# Altium footprint library Zmod.PcbLib: 129 footprints (part 5 of 9)
Each footprint in its own frame and in the unit in brackets; x right, y up, seen from the top. Pads: shape width x height; smd on the part's side, far side on the other; paste and mask are expansions set on the pad; w line width, h text height; cw(c..) or ccw(c..) is an arc to the next point about the centre after c.
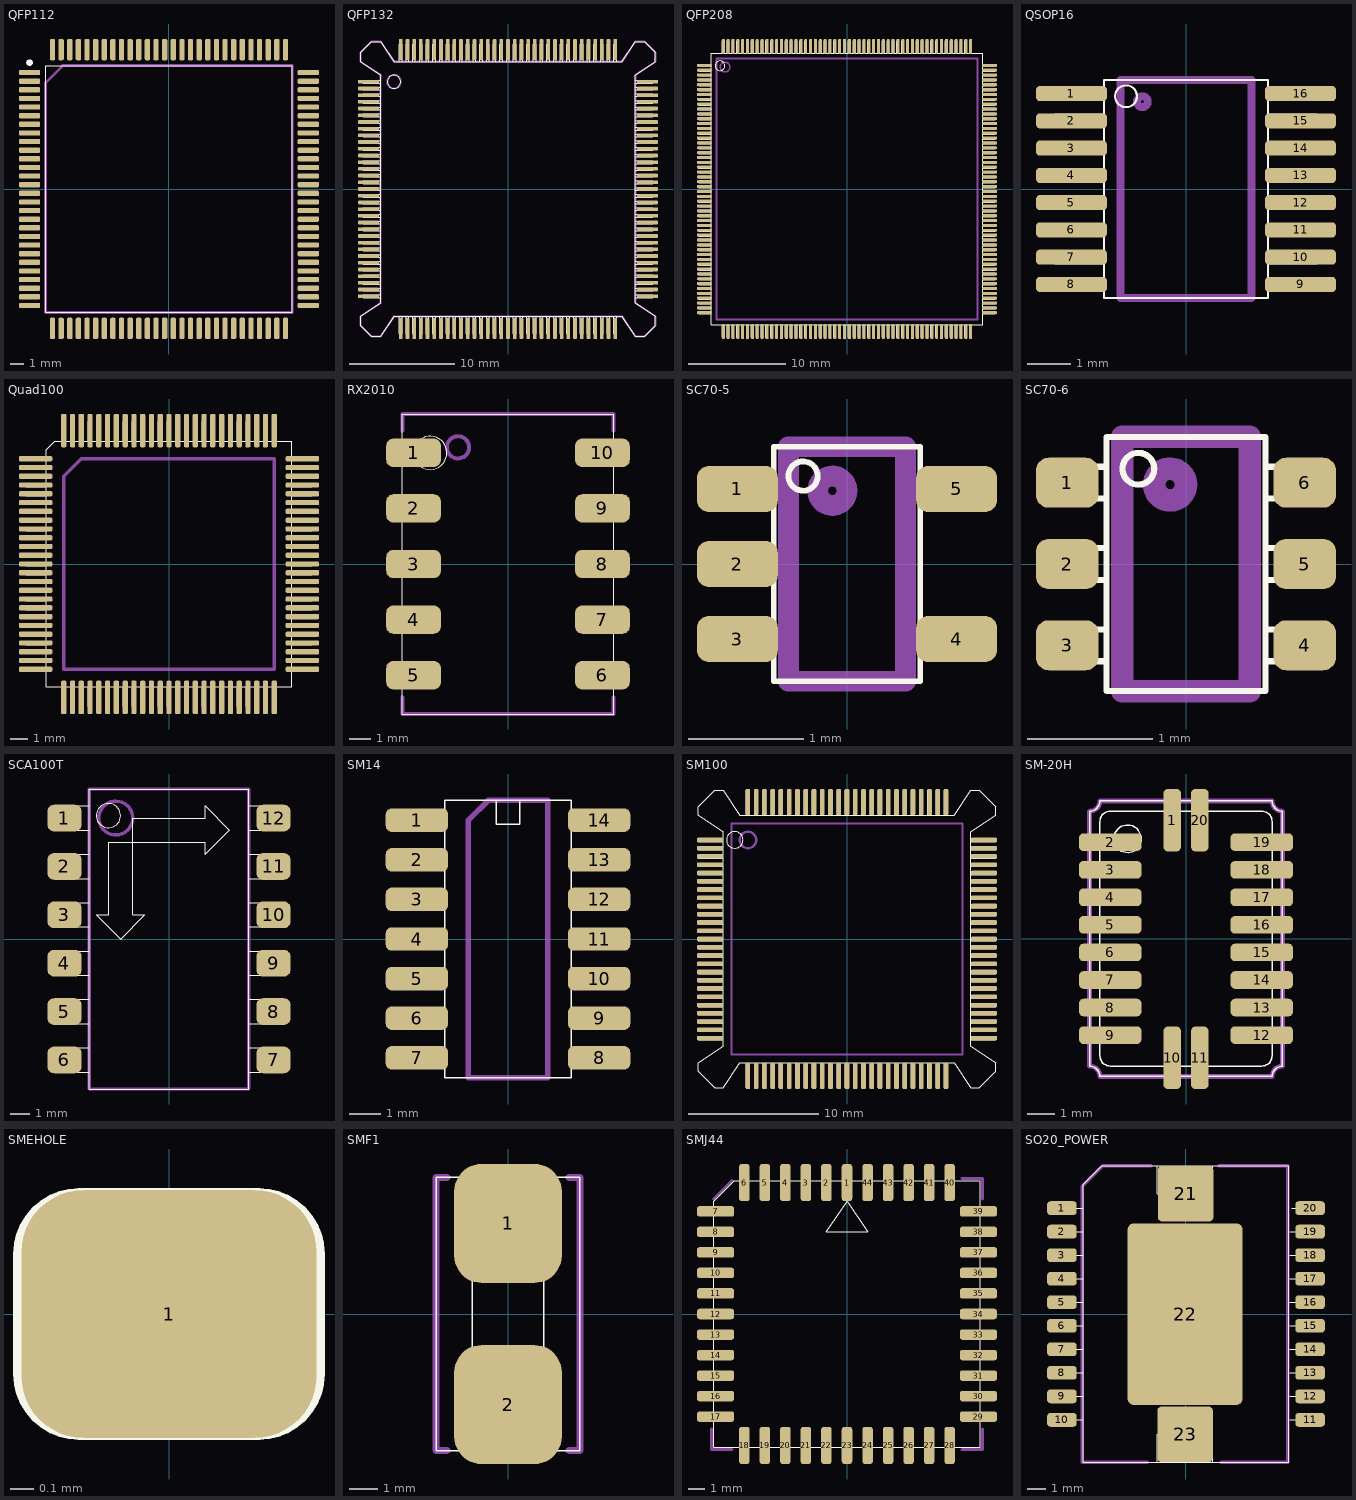
[diagram p4: the footprints below, top view; thin cyan lines are the x and y axes]

## QFP112 [mm] "QFP; 112 Leads; Body 20 x 20 mm; Pitch 0.65 mm. Rev. 1"
height 1.6
pads (112):
  rrect50% 1.6x0.4 smd: 1(-10.5,8.775) 2(-10.5,8.125) 3(-10.5,7.475) 4(-10.5,6.825) 5(-10.5,6.175) 6(-10.5,5.525) 7(-10.5,4.875) 8(-10.5,4.225) 9(-10.5,3.575) 10(-10.5,2.925) 11(-10.5,2.275) 12(-10.5,1.625) 13(-10.5,0.975) 14(-10.5,0.325) 15(-10.5,-0.325) 16(-10.5,-0.975) 17(-10.5,-1.625) 18(-10.5,-2.275) 19(-10.5,-2.925) 20(-10.5,-3.575) 21(-10.5,-4.225) 22(-10.5,-4.875) 23(-10.5,-5.525) 24(-10.5,-6.175) 25(-10.5,-6.825) 26(-10.5,-7.475) 27(-10.5,-8.125) 28(-10.5,-8.775) 57(10.5,-8.775) 58(10.5,-8.125) 59(10.5,-7.475) 60(10.5,-6.825) 61(10.5,-6.175) 62(10.505,-5.525) 63(10.5,-4.875) 64(10.5,-4.225) 65(10.5,-3.575) 66(10.5,-2.925) 67(10.5,-2.275) 68(10.5,-1.625) 69(10.5,-0.975) 70(10.5,-0.325) 71(10.5,0.325) 72(10.5,0.975) 73(10.5,1.625) 74(10.5,2.275) 75(10.5,2.925) 76(10.5,3.575) 77(10.5,4.225) 78(10.5,4.875) 79(10.5,5.525) 80(10.5,6.175) 81(10.5,6.825) 82(10.5,7.475) 83(10.5,8.125) 84(10.5,8.775)
  rrect50% 0.4x1.6 smd: 29(-8.775,-10.5) 30(-8.125,-10.5) 31(-7.475,-10.5) 32(-6.825,-10.5) 33(-6.175,-10.5) 34(-5.525,-10.5) 35(-4.875,-10.5) 36(-4.225,-10.5) 37(-3.575,-10.5) 38(-2.925,-10.5) 39(-2.275,-10.5) 40(-1.625,-10.5) 41(-0.975,-10.5) 42(-0.325,-10.5) 43(0.325,-10.5) 44(0.975,-10.5) 45(1.625,-10.5) 46(2.275,-10.5) 47(2.925,-10.5) 48(3.575,-10.5) 49(4.225,-10.5) 50(4.875,-10.5) 51(5.525,-10.5) 52(6.175,-10.5) 53(6.825,-10.5) 54(7.475,-10.5) 55(8.125,-10.5) 56(8.775,-10.5) 85(8.775,10.5) 86(8.125,10.5) 87(7.475,10.5) 88(6.825,10.5) 89(6.175,10.5) 90(5.525,10.5) 91(4.875,10.5) 92(4.225,10.5) 93(3.575,10.5) 94(2.925,10.5) 95(2.275,10.5) 96(1.625,10.5) 97(0.975,10.5) 98(0.325,10.5) 99(-0.325,10.5) 100(-0.975,10.5) 101(-1.625,10.5) 102(-2.275,10.5) 103(-2.925,10.5) 104(-3.575,10.5) 105(-4.225,10.5) 106(-4.875,10.5) 107(-5.525,10.5) 108(-6.175,10.5) 109(-6.825,10.5) 110(-7.475,10.5) 111(-8.125,10.5) 112(-8.775,10.5)
Top Overlay:
  circle w0.25: c-10.505,9.525 r0.125
  lines w0.05: -9.3,-9.3 -9.3,9.3 9.3,9.3 9.3,-9.3 -9.3,-9.3
Mechanical 15:
  lines w0.2: -9.3,-9.3 -9.3,8 -8,9.3 9.3,9.3 9.3,-9.3 -9.3,-9.3
  text ".Designator" at -6.8,-0.2 h1.5

## QFP132 [mm]
height 4.318
pads (132):
  rrect50% 2x0.35 smd paste+0: 1(-13.208,10.16) 2(-13.208,9.525) 3(-13.208,8.89) 4(-13.208,8.255) 5(-13.208,7.62) 6(-13.208,6.985) 7(-13.208,6.35) 8(-13.208,5.715) 9(-13.208,5.08) 10(-13.208,4.445) 11(-13.208,3.81) 12(-13.208,3.175) 13(-13.208,2.54) 14(-13.208,1.905) 15(-13.208,1.27) 16(-13.208,0.635) 17(-13.208,0) 18(-13.208,-0.635) 19(-13.208,-1.27) 20(-13.208,-1.905) 21(-13.208,-2.54) 22(-13.208,-3.175) 23(-13.208,-3.81) 24(-13.208,-4.445) 25(-13.208,-5.08) 26(-13.208,-5.715) 27(-13.208,-6.35) 28(-13.208,-6.985) 29(-13.208,-7.62) 30(-13.208,-8.255) 31(-13.208,-8.89) 32(-13.208,-9.525) 33(-13.208,-10.16) 67(13.208,-10.16) 68(13.208,-9.525) 69(13.208,-8.89) 70(13.208,-8.255) 71(13.208,-7.62) 72(13.208,-6.985) 73(13.208,-6.35) 74(13.208,-5.715) 75(13.208,-5.08) 76(13.208,-4.445) 77(13.208,-3.81) 78(13.208,-3.175) 79(13.208,-2.54) 80(13.208,-1.905) 81(13.208,-1.27) 82(13.208,-0.635) 83(13.208,0) 84(13.208,0.635) 85(13.208,1.27) 86(13.208,1.905) 87(13.208,2.54) 88(13.208,3.175) 89(13.208,3.81) 90(13.208,4.445) 91(13.208,5.08) 92(13.208,5.715) 93(13.208,6.35) 94(13.208,6.985) 95(13.208,7.62) 96(13.208,8.255) 97(13.208,8.89) 98(13.208,9.525) 99(13.208,10.16)
  rrect50% 0.35x2 smd paste+0: 34(-10.16,-13.208) 35(-9.525,-13.208) 36(-8.89,-13.208) 37(-8.255,-13.208) 38(-7.62,-13.208) 39(-6.985,-13.208) 40(-6.35,-13.208) 41(-5.715,-13.208) 42(-5.08,-13.208) 43(-4.445,-13.208) 44(-3.81,-13.208) 45(-3.175,-13.208) 46(-2.54,-13.208) 47(-1.905,-13.208) 48(-1.27,-13.208) 49(-0.635,-13.208) 50(0,-13.208) 51(0.635,-13.208) 52(1.27,-13.208) 53(1.905,-13.208) 54(2.54,-13.208) 55(3.175,-13.208) 56(3.81,-13.208) 57(4.445,-13.208) 58(5.08,-13.208) 59(5.715,-13.208) 60(6.35,-13.208) 61(6.985,-13.208) 62(7.62,-13.208) 63(8.255,-13.208) 64(8.89,-13.208) 65(9.525,-13.208) 66(10.16,-13.208) 100(10.16,13.208) 101(9.525,13.208) 102(8.89,13.208) 103(8.255,13.208) 104(7.62,13.208) 105(6.985,13.208) 106(6.35,13.208) 107(5.715,13.208) 108(5.08,13.208) 109(4.445,13.208) 110(3.81,13.208) 111(3.175,13.208) 112(2.54,13.208) 113(1.905,13.208) 114(1.27,13.208) 115(0.635,13.208) 116(0,13.208) 117(-0.635,13.208) 118(-1.27,13.208) 119(-1.905,13.208) 120(-2.54,13.208) 121(-3.175,13.208) 122(-3.81,13.208) 123(-4.445,13.208) 124(-5.08,13.208) 125(-5.715,13.208) 126(-6.35,13.208) 127(-6.985,13.208) 128(-7.62,13.208) 129(-8.255,13.208) 130(-8.89,13.208) 131(-9.525,13.208) 132(-10.16,13.208)
Top Overlay:
  drawing of 427 lines, arcs and shapes, not listed
Mechanical 15:
  lines w0.18: -13.97,-12.954 -12.954,-13.97 -12.065,-13.97 -10.795,-12.065 10.795,-12.065 12.065,-13.97 12.954,-13.97 13.97,-12.954 13.97,-12.065 12.065,-10.795 12.065,10.795 13.97,12.065 13.97,12.954 12.954,13.97 12.065,13.97 10.795,12.065 -10.795,12.065 -12.065,13.97 -12.954,13.97 -13.97,12.954 -13.97,12.065 -12.065,10.795 -12.065,-10.795 -13.97,-12.065 -13.97,-12.954 ; -11.43,10.16 ccw(c-10.795,10.16) -10.16,10.16 ccw(c-10.795,10.16) -11.43,10.16
  text ".Designator" at -5.207,8.763 h1.5

## QFP208 [mil]
height 170
pads (208):
  rrect50% 60x12 smd paste+0: 1(-578.74,501.97) 2(-578.74,482.28) 3(-578.74,462.6) 4(-578.74,442.91) 5(-578.74,423.23) 6(-578.74,403.54) 7(-578.74,383.86) 8(-578.74,364.17) 9(-578.74,344.49) 10(-578.74,324.8) 11(-578.74,305.12) 12(-578.74,285.43) 13(-578.74,265.75) 14(-578.74,246.06) 15(-578.74,226.38) 16(-578.74,206.69) 17(-578.74,187.01) 18(-578.74,167.32) 19(-578.74,147.64) 20(-578.74,127.95) 21(-578.74,108.27) 22(-578.74,88.58) 23(-578.74,68.9) 24(-578.74,49.21) 25(-578.74,29.53) 26(-578.74,9.84) 27(-578.74,-9.84) 28(-578.74,-29.53) 29(-578.74,-49.21) 30(-578.74,-68.9) 31(-578.74,-88.58) 32(-578.74,-108.27) 33(-578.74,-127.95) 34(-578.74,-147.64) 35(-578.74,-167.32) 36(-578.74,-187.01) 37(-578.74,-206.69) 38(-578.74,-226.38) 39(-578.74,-246.06) 40(-578.74,-265.75) 41(-578.74,-285.43) 42(-578.74,-305.12) 43(-578.74,-324.8) 44(-578.74,-344.49) 45(-578.74,-364.17) 46(-578.74,-383.86) 47(-578.74,-403.54) 48(-578.74,-423.23) 49(-578.74,-442.91) 50(-578.74,-462.6) 51(-578.74,-482.28) 52(-578.74,-501.97) 105(578.74,-501.97) 106(578.74,-482.28) 107(578.74,-462.6) 108(578.74,-442.91) 109(578.74,-423.23) 110(578.74,-403.54) 111(578.74,-383.86) 112(578.74,-364.17) 113(578.74,-344.49) 114(578.74,-324.8) 115(578.74,-305.12) 116(578.74,-285.43) 117(578.74,-265.75) 118(578.74,-246.06) 119(578.74,-226.38) 120(578.74,-206.69) 121(578.74,-187.01) 122(578.74,-167.32) 123(578.74,-147.64) 124(578.74,-127.95) 125(578.74,-108.27) 126(578.74,-88.58) 127(578.74,-68.9) 128(578.74,-49.21) 129(578.74,-29.53) 130(578.74,-9.84) 131(578.74,9.84) 132(578.74,29.53) 133(578.74,49.21) 134(578.74,68.9) 135(578.74,88.58) 136(578.74,108.27) 137(578.74,127.95) 138(578.74,147.64) 139(578.74,167.32) 140(578.74,187.01) 141(578.74,206.69) 142(578.74,226.38) 143(578.74,246.06) 144(578.74,265.75) 145(578.74,285.43) 146(578.74,305.12) 147(578.74,324.8) 148(578.74,344.49) 149(578.74,364.17) 150(578.74,383.86) 151(578.74,403.54) 152(578.74,423.23) 153(578.74,442.91) 154(578.74,462.6) 155(578.74,482.28) 156(578.74,501.97)
  rrect50% 12x60 smd paste+0: 53(-501.97,-578.74) 54(-482.28,-578.74) 55(-462.6,-578.74) 56(-442.91,-578.74) 57(-423.23,-578.74) 58(-403.54,-578.74) 59(-383.86,-578.74) 60(-364.17,-578.74) 61(-344.49,-578.74) 62(-324.8,-578.74) 63(-305.12,-578.74) 64(-285.43,-578.74) 65(-265.75,-578.74) 66(-246.06,-578.74) 67(-226.38,-578.74) 68(-206.69,-578.74) 69(-187.01,-578.74) 70(-167.32,-578.74) 71(-147.64,-578.74) 72(-127.95,-578.74) 73(-108.27,-578.74) 74(-88.58,-578.74) 75(-68.9,-578.74) 76(-49.21,-578.74) 77(-29.53,-578.74) 78(-9.84,-578.74) 79(9.84,-578.74) 80(29.53,-578.74) 81(49.21,-578.74) 82(68.9,-578.74) 83(88.58,-578.74) 84(108.27,-578.74) 85(127.95,-578.74) 86(147.64,-578.74) 87(167.32,-578.74) 88(187.01,-578.74) 89(206.69,-578.74) 90(226.38,-578.74) 91(246.06,-578.74) 92(265.75,-578.74) 93(285.43,-578.74) 94(305.12,-578.74) 95(324.8,-578.74) 96(344.49,-578.74) 97(364.17,-578.74) 98(383.86,-578.74) 99(403.54,-578.74) 100(423.23,-578.74) 101(442.91,-578.74) 102(462.6,-578.74) 103(482.28,-578.74) 104(501.97,-578.74) 157(501.97,578.74) 158(482.28,578.74) 159(462.6,578.74) 160(442.91,578.74) 161(423.23,578.74) 162(403.54,578.74) 163(383.86,578.74) 164(364.17,578.74) 165(344.49,578.74) 166(324.8,578.74) 167(305.12,578.74) 168(285.43,578.74) 169(265.75,578.74) 170(246.06,578.74) 171(226.38,578.74) 172(206.69,578.74) 173(187.01,578.74) 174(167.32,578.74) 175(147.64,578.74) 176(127.95,578.74) 177(108.27,578.74) 178(88.58,578.74) 179(68.9,578.74) 180(49.21,578.74) 181(29.53,578.74) 182(9.84,578.74) 183(-9.84,578.74) 184(-29.53,578.74) 185(-49.21,578.74) 186(-68.9,578.74) 187(-88.58,578.74) 188(-108.27,578.74) 189(-127.95,578.74) 190(-147.64,578.74) 191(-167.32,578.74) 192(-187.01,578.74) 193(-206.69,578.74) 194(-226.38,578.74) 195(-246.06,578.74) 196(-265.75,578.74) 197(-285.43,578.74) 198(-305.12,578.74) 199(-324.8,578.74) 200(-344.49,578.74) 201(-364.17,578.74) 202(-383.86,578.74) 203(-403.54,578.74) 204(-423.23,578.74) 205(-442.91,578.74) 206(-462.6,578.74) 207(-482.28,578.74) 208(-501.97,578.74)
Top Overlay:
  drawing of 631 lines, arcs and shapes, not listed
Mechanical 15:
  lines w7: -530,-530 530,-530 530,530 -530,530 -530,-530 ; -514.69,495 cw(c-495,495) -475.31,495 cw(c-495,495) -514.69,495
  text ".Designator" at -160,365 h59.06

## QSOP16 [mm]
height 1.778
pads (16):
  rrect50% 1.65x0.35 smd paste+0: 1(-2.667,2.222) 2(-2.667,1.587) 3(-2.667,0.953) 4(-2.667,0.318) 5(-2.667,-0.318) 6(-2.667,-0.953) 7(-2.667,-1.587) 8(-2.667,-2.222) 9(2.667,-2.222) 10(2.667,-1.587) 11(2.667,-0.953) 12(2.667,-0.318) 13(2.667,0.318) 14(2.667,0.953) 15(2.667,1.587) 16(2.667,2.222)
Top Overlay:
  circle w0.05: c-1.397,2.159 r0.254
  lines w0.05: -1.905,-2.362 -3.048,-2.362 -3.048,-2.083 -1.905,-2.083 ; -1.905,-1.727 -3.048,-1.727 -3.048,-1.448 -1.905,-1.448 ; -1.905,-1.092 -3.048,-1.092 -3.048,-0.813 -1.905,-0.813 ; -1.905,-0.457 -3.048,-0.457 -3.048,-0.178 -1.905,-0.178 ; -1.905,0.178 -3.048,0.178 -3.048,0.457 -1.905,0.457 ; -1.905,0.813 -3.048,0.813 -3.048,1.092 -1.905,1.092 ; -1.905,1.448 -3.048,1.448 -3.048,1.727 -1.905,1.727 ; -1.905,2.083 -3.048,2.083 -3.048,2.362 -1.905,2.362 ; 1.905,-2.362 3.048,-2.362 3.048,-2.083 1.905,-2.083 ; 1.905,-1.727 3.048,-1.727 3.048,-1.448 1.905,-1.448 ; 1.905,-1.092 3.048,-1.092 3.048,-0.813 1.905,-0.813 ; 1.905,-0.457 3.048,-0.457 3.048,-0.178 1.905,-0.178 ; 1.905,0.178 3.048,0.178 3.048,0.457 1.905,0.457 ; 1.905,0.813 3.048,0.813 3.048,1.092 1.905,1.092 ; 1.905,1.448 3.048,1.448 3.048,1.727 1.905,1.727 ; 1.905,2.083 3.048,2.083 3.048,2.362 1.905,2.362 ; -1.905,-2.54 -1.905,2.54 1.905,2.54 1.905,-2.54 -1.905,-2.54
Mechanical 15:
  circle w0.18: c-1.016,2.032 r0.127
  lines w0.18: -1.524,-2.54 1.524,-2.54 1.524,2.54 -1.524,2.54 -1.524,-2.54
  text ".Designator" at -0.381,-2.159 h1.5

## Quad100 [mm]
pads (100):
  rrect50% 1.9x0.3 smd: 1(-7.6,6) 2(-7.6,5.5) 3(-7.6,5) 4(-7.6,4.5) 5(-7.6,4) 6(-7.6,3.5) 7(-7.6,3) 8(-7.6,2.5) 9(-7.6,2) 10(-7.6,1.5) 11(-7.6,1) 12(-7.6,0.5) 13(-7.6,0) 14(-7.6,-0.5) 15(-7.6,-1) 16(-7.6,-1.5) 17(-7.6,-2) 18(-7.6,-2.5) 19(-7.6,-3) 20(-7.6,-3.5) 21(-7.6,-4) 22(-7.6,-4.5) 23(-7.6,-5) 24(-7.6,-5.5) 25(-7.6,-6) 51(7.6,-6) 52(7.6,-5.5) 53(7.6,-5) 54(7.6,-4.5) 55(7.6,-4) 56(7.6,-3.5) 57(7.6,-3) 58(7.6,-2.5) 59(7.6,-2) 60(7.6,-1.5) 61(7.6,-1) 62(7.6,-0.5) 63(7.6,0) 64(7.6,0.5) 65(7.6,1) 66(7.6,1.5) 67(7.6,2) 68(7.6,2.5) 69(7.6,3) 70(7.6,3.5) 71(7.6,4) 72(7.6,4.5) 73(7.6,5) 74(7.6,5.5) 75(7.6,6)
  rrect50% 0.3x1.9 smd: 26(-6,-7.6) 27(-5.5,-7.6) 28(-5,-7.6) 29(-4.5,-7.6) 30(-4,-7.6) 31(-3.5,-7.6) 32(-3,-7.6) 33(-2.5,-7.6) 34(-2,-7.6) 35(-1.5,-7.6) 36(-1,-7.6) 37(-0.5,-7.6) 38(0,-7.6) 39(0.5,-7.6) 40(1,-7.6) 41(1.5,-7.6) 42(2,-7.6) 43(2.5,-7.6) 44(3,-7.6) 45(3.5,-7.6) 46(4,-7.6) 47(4.5,-7.6) 48(5,-7.6) 49(5.5,-7.6) 50(6,-7.6) 76(6,7.6) 77(5.5,7.6) 78(5,7.6) 79(4.5,7.6) 80(4,7.6) 81(3.5,7.6) 82(3,7.6) 83(2.5,7.6) 84(2,7.6) 85(1.5,7.6) 86(1,7.6) 87(0.5,7.6) 88(0,7.6) 89(-0.5,7.6) 90(-1,7.6) 91(-1.5,7.6) 92(-2,7.6) 93(-2.5,7.6) 94(-3,7.6) 95(-3.5,7.6) 96(-4,7.6) 97(-4.5,7.6) 98(-5,7.6) 99(-5.5,7.6) 100(-6,7.6)
Top Overlay:
  drawing of 317 lines, arcs and shapes, not listed
Mechanical 15:
  lines w0.18: -6,-6 -6,5 -5,6 6,6 6,-6 -6,-6
  text ".Designator" at -6.159,3.381 h1.5

## RX2010 [mm]
height 2.54
pads (10):
  rrect50% 2.5x1.3 smd paste+0: 1(-4.318,5.08) 2(-4.318,2.54) 3(-4.318,0) 4(-4.318,-2.54) 5(-4.318,-5.08) 6(4.318,-5.08) 7(4.318,-2.54) 8(4.318,0) 9(4.318,2.54) 10(4.318,5.08)
Top Overlay:
  circle w0.05: c-3.556,5.08 r0.762
  lines w0.05: -4.826,-6.858 -4.826,6.858 4.826,6.858 4.826,-6.858 -4.826,-6.858
Mechanical 15:
  circle w0.18: c-2.286,5.334 r0.508
  lines w0.18: -4.826,-6.096 -4.826,-6.858 4.826,-6.858 4.826,-6.096 ; -4.826,6.096 -4.826,6.858 4.826,6.858 4.826,6.096
  text ".Designator" at -1.397,-5.969 h1.5

## SC70-5 [mm] "Rev. 2, pad size was 0.5x0.4mm, round"
height 2.413
pads (5):
  rrect50% 0.7x0.4 smd paste+0: 1(-0.95,0.65) 2(-0.95,0) 3(-0.95,-0.65) 4(0.95,-0.65) 5(0.95,0.65)
Top Overlay:
  circle w0.05: c-0.381,0.762 r0.127
  lines w0.05: -0.635,-0.777 -1.016,-0.777 -1.016,-0.523 -0.635,-0.523 ; -0.635,-0.127 -1.016,-0.127 -1.016,0.127 -0.635,0.127 ; -0.635,0.523 -1.016,0.523 -1.016,0.777 -0.635,0.777 ; 0.635,-0.777 1.016,-0.777 1.016,-0.523 0.635,-0.523 ; 0.635,0.523 1.016,0.523 1.016,0.777 0.635,0.777 ; -0.635,-1.016 -0.635,1.016 0.635,1.016 0.635,-1.016 -0.635,-1.016
Mechanical 15:
  circle w0.18: c-0.127,0.635 r0.127
  lines w0.18: -0.508,-1.016 -0.508,1.016 0.508,1.016 0.508,-1.016 -0.508,-1.016
  text ".Designator" at 0.127,-1.143 h1.5

## SC70-6 [mm]
height 2.413
pads (6):
  rrect50% 0.5x0.4 smd paste+0: 1(-0.95,0.65) 2(-0.95,0) 3(-0.95,-0.65) 4(0.95,-0.65) 5(0.95,0) 6(0.95,0.65)
Top Overlay:
  circle w0.05: c-0.381,0.762 r0.127
  lines w0.05: -0.635,-0.777 -1.016,-0.777 -1.016,-0.523 -0.635,-0.523 ; -0.635,-0.127 -1.016,-0.127 -1.016,0.127 -0.635,0.127 ; -0.635,0.523 -1.016,0.523 -1.016,0.777 -0.635,0.777 ; 0.635,-0.777 1.016,-0.777 1.016,-0.523 0.635,-0.523 ; 0.635,-0.127 1.016,-0.127 1.016,0.127 0.635,0.127 ; 0.635,0.523 1.016,0.523 1.016,0.777 0.635,0.777 ; -0.635,-1.016 0.635,-1.016 0.635,1.016 -0.635,1.016 -0.635,-1.016
Mechanical 15:
  circle w0.18: c-0.127,0.635 r0.127
  lines w0.18: -0.508,-1.016 0.508,-1.016 0.508,1.016 -0.508,1.016 -0.508,-1.016
  text ".Designator" at 0.127,-1.143 h1.5

## SCA100T [mm]
height 5.08
pads (12):
  rrect50% 1.8x1.4 smd paste+0: 1(-5.486,6.35) 2(-5.486,3.81) 3(-5.486,1.27) 4(-5.486,-1.27) 5(-5.486,-3.81) 6(-5.486,-6.35) 7(5.486,-6.35) 8(5.486,-3.81) 9(5.486,-1.27) 10(5.486,1.27) 11(5.486,3.81) 12(5.486,6.35)
Top Overlay:
  circle w0.05: c-3.175,6.477 r0.635
  lines w0.05: -4.953,-6.604 -5.715,-6.604 -5.715,-6.096 -4.953,-6.096 ; -4.953,-4.064 -5.715,-4.064 -5.715,-3.556 -4.953,-3.556 ; -4.953,-1.524 -5.715,-1.524 -5.715,-1.016 -4.953,-1.016 ; -4.953,1.016 -5.715,1.016 -5.715,1.524 -4.953,1.524 ; -4.953,3.556 -5.715,3.556 -5.715,4.064 -4.953,4.064 ; -4.953,6.096 -5.715,6.096 -5.715,6.604 -4.953,6.604 ; -4.191,-6.985 -4.953,-6.985 -4.953,-5.715 -4.191,-5.715 ; -4.191,-4.445 -4.953,-4.445 -4.953,-3.175 -4.191,-3.175 ; -4.191,-1.905 -4.953,-1.905 -4.953,-0.635 -4.191,-0.635 ; -4.191,0.635 -4.953,0.635 -4.953,1.905 -4.191,1.905 ; -4.191,3.175 -4.953,3.175 -4.953,4.445 -4.191,4.445 ; -4.191,5.715 -4.953,5.715 -4.953,6.985 -4.191,6.985 ; 4.191,-6.985 4.953,-6.985 4.953,-5.715 4.191,-5.715 ; 4.191,-4.445 4.953,-4.445 4.953,-3.175 4.191,-3.175 ; 4.191,-1.905 4.953,-1.905 4.953,-0.635 4.191,-0.635 ; 4.191,0.635 4.953,0.635 4.953,1.905 4.191,1.905 ; 4.191,3.175 4.953,3.175 4.953,4.445 4.191,4.445 ; 4.191,5.715 4.953,5.715 4.953,6.985 4.191,6.985 ; 4.953,-6.604 5.715,-6.604 5.715,-6.096 4.953,-6.096 ; 4.953,-4.064 5.715,-4.064 5.715,-3.556 4.953,-3.556 ; 4.953,-1.524 5.715,-1.524 5.715,-1.016 4.953,-1.016 ; 4.953,1.016 5.715,1.016 5.715,1.524 4.953,1.524 ; 4.953,3.556 5.715,3.556 5.715,4.064 4.953,4.064 ; 4.953,6.096 5.715,6.096 5.715,6.604 4.953,6.604 ; -1.905,5.08 -1.905,1.27 -1.27,1.27 -2.54,0 -3.81,1.27 -3.175,1.27 -3.175,5.08 -1.905,5.08 ; -1.905,5.08 -1.905,6.35 1.905,6.35 1.905,6.985 3.175,5.715 1.905,4.445 1.905,5.08 -1.905,5.08 ; -4.191,-7.874 -4.191,7.874 4.191,7.874 4.191,-7.874 -4.191,-7.874
Mechanical 15:
  circle w0.18: c-2.794,6.35 r0.889
  lines w0.18: -4.191,-7.874 -4.191,7.874 4.191,7.874 4.191,-7.874 -4.191,-7.874
  text ".Designator" at -1.524,-7.112 h1.5

## SM14 [mm]
height 1.905
pads (14):
  rrect50% 2x0.75 smd paste+0: 1(-2.921,3.81) 2(-2.921,2.54) 3(-2.921,1.27) 4(-2.921,0) 5(-2.921,-1.27) 6(-2.921,-2.54) 7(-2.921,-3.81) 8(2.921,-3.81) 9(2.921,-2.54) 10(2.921,-1.27) 11(2.921,0) 12(2.921,1.27) 13(2.921,2.54) 14(2.921,3.81)
Top Overlay:
  lines w0.05: -2.032,-4.064 -3.175,-4.064 -3.175,-3.556 -2.032,-3.556 ; -2.032,-2.794 -3.175,-2.794 -3.175,-2.286 -2.032,-2.286 ; -2.032,-1.524 -3.175,-1.524 -3.175,-1.016 -2.032,-1.016 ; -2.032,-0.254 -3.175,-0.254 -3.175,0.254 -2.032,0.254 ; -2.032,1.016 -3.175,1.016 -3.175,1.524 -2.032,1.524 ; -2.032,2.286 -3.175,2.286 -3.175,2.794 -2.032,2.794 ; -2.032,3.556 -3.175,3.556 -3.175,4.064 -2.032,4.064 ; -0.381,4.445 -0.381,3.683 0.381,3.683 0.381,4.445 ; 2.032,-4.064 3.175,-4.064 3.175,-3.556 2.032,-3.556 ; 2.032,-2.794 3.175,-2.794 3.175,-2.286 2.032,-2.286 ; 2.032,-1.524 3.175,-1.524 3.175,-1.016 2.032,-1.016 ; 2.032,-0.254 3.175,-0.254 3.175,0.254 2.032,0.254 ; 2.032,1.016 3.175,1.016 3.175,1.524 2.032,1.524 ; 2.032,2.286 3.175,2.286 3.175,2.794 2.032,2.794 ; 2.032,3.556 3.175,3.556 3.175,4.064 2.032,4.064 ; -2.032,-4.445 -2.032,4.445 2.032,4.445 2.032,-4.445 -2.032,-4.445
Mechanical 15:
  lines w0.18: -1.27,-4.445 1.27,-4.445 1.27,4.445 -0.635,4.445 -1.27,3.81 -1.27,-4.445
  text ".Designator" at -0.762,-4.064 h1.5

## SM100 [mm]
height 2.54
pads (100):
  rrect50% 2x0.35 smd paste+0: 1(-10.541,7.62) 2(-10.541,6.985) 3(-10.541,6.35) 4(-10.541,5.715) 5(-10.541,5.08) 6(-10.541,4.445) 7(-10.541,3.81) 8(-10.541,3.175) 9(-10.541,2.54) 10(-10.541,1.905) 11(-10.541,1.27) 12(-10.541,0.635) 13(-10.541,0) 14(-10.541,-0.635) 15(-10.541,-1.27) 16(-10.541,-1.905) 17(-10.541,-2.54) 18(-10.541,-3.175) 19(-10.541,-3.81) 20(-10.541,-4.445) 21(-10.541,-5.08) 22(-10.541,-5.715) 23(-10.541,-6.35) 24(-10.541,-6.985) 25(-10.541,-7.62) 51(10.541,-7.62) 52(10.541,-6.985) 53(10.541,-6.35) 54(10.541,-5.715) 55(10.541,-5.08) 56(10.541,-4.445) 57(10.541,-3.81) 58(10.541,-3.175) 59(10.541,-2.54) 60(10.541,-1.905) 61(10.541,-1.27) 62(10.541,-0.635) 63(10.541,0) 64(10.541,0.635) 65(10.541,1.27) 66(10.541,1.905) 67(10.541,2.54) 68(10.541,3.175) 69(10.541,3.81) 70(10.541,4.445) 71(10.541,5.08) 72(10.541,5.715) 73(10.541,6.35) 74(10.541,6.985) 75(10.541,7.62)
  rrect50% 0.35x2 smd paste+0: 26(-7.62,-10.541) 27(-6.985,-10.541) 28(-6.35,-10.541) 29(-5.715,-10.541) 30(-5.08,-10.541) 31(-4.445,-10.541) 32(-3.81,-10.541) 33(-3.175,-10.541) 34(-2.54,-10.541) 35(-1.905,-10.541) 36(-1.27,-10.541) 37(-0.635,-10.541) 38(0,-10.541) 39(0.635,-10.541) 40(1.27,-10.541) 41(1.905,-10.541) 42(2.54,-10.541) 43(3.175,-10.541) 44(3.81,-10.541) 45(4.445,-10.541) 46(5.08,-10.541) 47(5.715,-10.541) 48(6.35,-10.541) 49(6.985,-10.541) 50(7.62,-10.541) 76(7.62,10.541) 77(6.985,10.541) 78(6.35,10.541) 79(5.715,10.541) 80(5.08,10.541) 81(4.445,10.541) 82(3.81,10.541) 83(3.175,10.541) 84(2.54,10.541) 85(1.905,10.541) 86(1.27,10.541) 87(0.635,10.541) 88(0,10.541) 89(-0.635,10.541) 90(-1.27,10.541) 91(-1.905,10.541) 92(-2.54,10.541) 93(-3.175,10.541) 94(-3.81,10.541) 95(-4.445,10.541) 96(-5.08,10.541) 97(-5.715,10.541) 98(-6.35,10.541) 99(-6.985,10.541) 100(-7.62,10.541)
Top Overlay:
  drawing of 326 lines, arcs and shapes, not listed
Mechanical 15:
  lines w0.18: -8.89,-8.89 8.89,-8.89 8.89,8.89 -8.89,8.89 -8.89,-8.89 ; -8.255,7.62 ccw(c-7.62,7.62) -6.985,7.62 ccw(c-7.62,7.62) -8.255,7.62
  text ".Designator" at -6.985,4.953 h1.5

## SM-20H [mm]
height 2.032
pads (20):
  rrect50% 0.65x2.3 smd paste+0: 1(-0.508,4.369) 10(-0.508,-4.394) 11(0.508,-4.394) 20(0.508,4.369)
  rrect50% 2.3x0.65 smd paste+0: 2(-2.794,3.556) 3(-2.794,2.54) 4(-2.794,1.524) 5(-2.794,0.508) 6(-2.794,-0.508) 7(-2.794,-1.524) 8(-2.794,-2.54) 9(-2.794,-3.556) 12(2.794,-3.556) 13(2.794,-2.54) 14(2.794,-1.524) 15(2.794,-0.508) 16(2.794,0.508) 17(2.794,1.524) 18(2.794,2.54) 19(2.794,3.556)
Top Overlay:
  circle w0.05: c-2.159,3.683 r0.508
  lines w0.05: -3.556,-4.699 cw(c-3.556,-5.08) -3.175,-5.08 3.175,-5.08 cw(c3.556,-5.08) 3.556,-4.699 3.556,4.699 cw(c3.556,5.08) 3.175,5.08 -3.175,5.08 cw(c-3.556,5.08) -3.556,4.699 -3.556,-4.699 ; -3.175,-4.318 ccw(c-2.794,-4.318) -2.794,-4.699 2.794,-4.699 ccw(c2.794,-4.318) 3.175,-4.318 3.175,4.318 ccw(c2.794,4.318) 2.794,4.699 -2.794,4.699 ccw(c-2.794,4.318) -3.175,4.318 -3.175,-4.318
Mechanical 15:
  lines w0.18: -3.556,-4.699 cw(c-3.556,-5.08) -3.175,-5.08 3.175,-5.08 cw(c3.556,-5.08) 3.556,-4.699 3.556,4.699 cw(c3.556,5.08) 3.175,5.08 -3.175,5.08 cw(c-3.556,5.08) -3.556,4.699 -3.556,-4.699
  text ".Designator" at -1.143,-3.81 h1.5

## SMEHOLE [mm]
pads (1):
  rrect50% 1.25x1.05 smd: 1(0,0)
Top Overlay:
  lines w0.05: -0.635,-0.254 ccw(c-0.381,-0.254) -0.381,-0.508 0.381,-0.508 ccw(c0.381,-0.254) 0.635,-0.254 0.635,0.254 ccw(c0.381,0.254) 0.381,0.508 -0.381,0.508 ccw(c-0.381,0.254) -0.635,0.254 -0.635,-0.254
Mechanical 15:
  text ".Designator" at -0.762,0.254 h1.5

## SMF1 [mm]
pads (2):
  rrect50% 3.8x4.2 smd: 1(0,3.2) 2(0,-3.2)
Top Overlay:
  lines w0.05: -1.27,-4.826 -1.27,-5.08 1.27,-5.08 1.27,-4.826 ; -1.27,-1.778 -1.27,1.778 ; -1.27,4.826 -1.27,5.08 1.27,5.08 1.27,4.826 ; -0.381,-3.175 -0.381,-3.048 ; -0.381,3.048 -0.381,3.175 ; 0.381,-3.175 0.381,-3.048 ; 0.381,3.048 0.381,3.175 ; 1.27,-1.778 1.27,1.778 ; -1.397,-3.048 1.397,-3.048 ; -1.397,-3.048 -1.397,-1.778 1.397,-1.778 1.397,-3.048 ; -1.397,-3.048 -1.397,-4.191 -0.762,-4.191 -0.762,-3.175 0.762,-3.175 0.762,-4.191 1.397,-4.191 1.397,-3.048 ; -1.397,3.048 1.397,3.048 ; -1.397,3.048 -1.397,1.778 -1.27,1.778 ; -1.397,3.048 -1.397,4.191 -0.762,4.191 -0.762,3.175 0.762,3.175 0.762,4.191 1.397,4.191 1.397,3.048 ; -1.27,1.778 1.397,1.778 1.397,3.048 ; -2.54,-4.826 -2.54,4.826 2.54,4.826 2.54,-4.826 -2.54,-4.826
Mechanical 15:
  lines w0.25: -2.159,-4.826 -2.54,-4.826 -2.54,4.826 -2.159,4.826 ; 2.159,-4.826 2.54,-4.826 2.54,4.826 2.159,4.826
  text ".Designator" at -0.762,-4.699 h1.5

## SMJ44 [mm]
height 4.572
pads (44):
  rrect50% 0.65x2.3 smd paste+0: 1(0,8.128) 2(-1.27,8.128) 3(-2.54,8.128) 4(-3.81,8.128) 5(-5.08,8.128) 6(-6.35,8.128) 18(-6.35,-8.128) 19(-5.08,-8.128) 20(-3.81,-8.128) 21(-2.54,-8.128) 22(-1.27,-8.128) 23(0,-8.128) 24(1.27,-8.128) 25(2.54,-8.128) 26(3.81,-8.128) 27(5.08,-8.128) 28(6.35,-8.128) 40(6.35,8.128) 41(5.08,8.128) 42(3.81,8.128) 43(2.54,8.128) 44(1.27,8.128)
  rrect50% 2.3x0.65 smd paste+0: 7(-8.128,6.35) 8(-8.128,5.08) 9(-8.128,3.81) 10(-8.128,2.54) 11(-8.128,1.27) 12(-8.128,0) 13(-8.128,-1.27) 14(-8.128,-2.54) 15(-8.128,-3.81) 16(-8.128,-5.08) 17(-8.128,-6.35) 29(8.128,-6.35) 30(8.128,-5.08) 31(8.128,-3.81) 32(8.128,-2.54) 33(8.128,-1.27) 34(8.128,0) 35(8.128,1.27) 36(8.128,2.54) 37(8.128,3.81) 38(8.128,5.08) 39(8.128,6.35)
Top Overlay:
  lines w0.05: -8.255,-8.255 -8.255,6.985 -6.985,8.255 8.255,8.255 8.255,-8.255 -8.255,-8.255 ; -1.27,5.08 0,6.985 1.27,5.08 -1.27,5.08
Mechanical 15:
  lines w0.18: -8.382,-7.112 -8.382,-8.382 -7.112,-8.382 ; -8.255,7.112 -7.112,8.255 ; 7.112,-8.382 8.382,-8.382 8.382,-7.112 ; 7.112,8.382 8.382,8.382 8.382,7.112
  text ".Designator" at -6.223,5.08 h1.5

## SO20_POWER [mm] "ST Micro Jedec MO-166 Rev. 1"
height 3.6
pads (23):
  rrect50% 1.6x0.75 smd: 1(-6.7,5.715) 2(-6.7,4.445) 3(-6.7,3.175) 4(-6.7,1.905) 5(-6.7,0.635) 6(-6.7,-0.635) 7(-6.7,-1.905) 8(-6.7,-3.175) 9(-6.7,-4.445) 10(-6.7,-5.715) 11(6.7,-5.715) 12(6.7,-4.445) 13(6.7,-3.175) 14(6.7,-1.905) 15(6.7,-0.635) 16(6.7,0.635) 17(6.7,1.905) 18(6.7,3.175) 19(6.7,4.445) 20(6.7,5.715)
  rrect15% 3x3 smd: 21(-0.025,6.5) 23(-0.05,-6.5)
  rrect10% 6.2x9.8 smd: 22(-0.05,-0.01)
Top Overlay:
  lines w0.05: -6.7,1.905 -6.695,1.9 ; -6.6,-5.715 -5.6,-5.715 ; -6.6,-4.445 -5.6,-4.445 ; -6.6,-3.175 -5.6,-3.175 ; -6.6,-1.905 -5.6,-1.905 ; -6.6,-0.635 -5.6,-0.635 ; -6.6,0.635 -5.6,0.635 ; -6.6,3.175 -5.6,3.175 ; -6.6,4.445 -5.6,4.445 ; -6.6,5.715 -5.6,5.715 ; -6.345,1.9 -5.855,1.9 ; -5.955,1.9 -5.95,1.905 ; -5.85,1.905 -5.6,1.905 ; 5.6,-5.715 6.6,-5.715 ; 5.6,-4.445 6.6,-4.445 ; 5.6,-3.175 6.6,-3.175 ; 5.6,-1.905 6.6,-1.905 ; 5.6,-0.635 6.6,-0.635 ; 5.6,0.635 6.6,0.635 ; 5.6,1.905 6.6,1.905 ; 5.6,3.175 6.6,3.175 ; 5.6,4.445 6.6,4.445 ; 5.7,5.715 6.7,5.715 ; -1.55,-8 -1.55,-6.5 1.45,-6.5 1.45,-8 ; -1.55,-8 -5.55,-8 -5.55,7 -4.55,8 -1.55,8 ; -1.55,-8 1.45,-8 ; -1.55,8 -1.55,6.5 1.45,6.5 1.45,8 ; -1.55,8 1.45,8 ; 1.45,-8 5.55,-8 5.55,8 1.45,8
Top Solder:
  rectangle: -3.2,-5 3.1,5
  rectangle: -1.7,-8.1 1.6,-4.9
  rectangle: -1.6,4.9 1.6,8.1
Mechanical 15:
  lines w0.18: -2.1,-8 -5.6,-8 -5.6,-6.4 -5.6,6.9 -5.5,7 -4.5,8 -1.9,8 ; 1.8,8 5.5,8 5.5,-8 1.9,-8
  text ".Designator" at -6.8,-0.3 h1.5